# Altium footprint library PcbLib1.PcbLib: 31 footprints (part 2 of 2)
Each footprint in its own frame and in the unit in brackets; x right, y up, seen from the top. Pads: shape width x height; smd on the part's side, far side on the other; paste and mask are expansions set on the pad; w line width, h text height; cw(c..) or ccw(c..) is an arc to the next point about the centre after c.
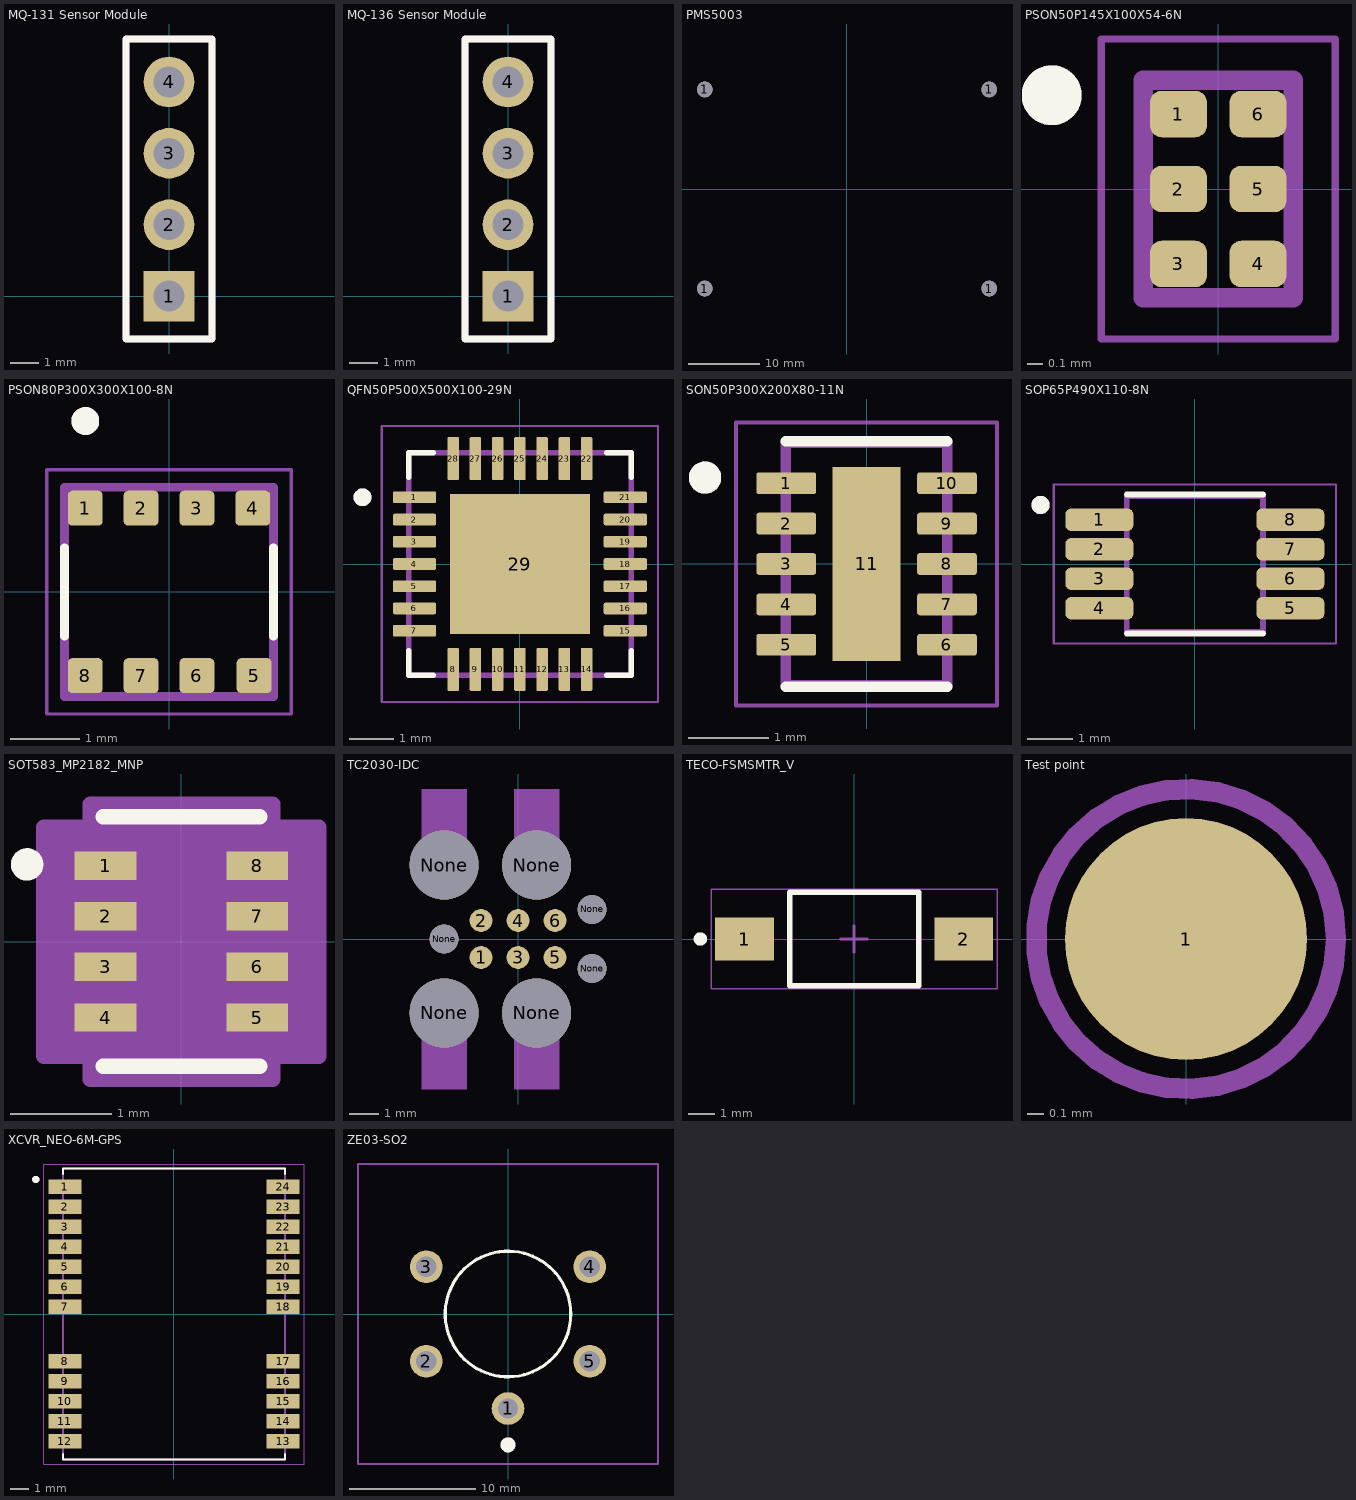
[diagram p1: the footprints below, top view; thin cyan lines are the x and y axes]

## MQ-131 Sensor Module [mm]
pads (4):
  rect 1.8x1.8 hole 1.1: 1(0,0)
  round 1.8 hole 1.1: 2(0,2.54) 3(0,5.08) 4(0,7.62)
Top Overlay:
  lines w0.254: -1.524,-1.524 1.524,-1.524 1.524,9.144 -1.524,9.144 -1.524,-1.524
Mechanical 13:
  lines w0.254: -1.524,-1.524 -1.524,9.144 1.524,9.144 1.524,-1.524 -1.524,-1.524
3D body "MQ-131 revised.step": height 41, standoff -2.12, extent -21.85,-6.465 0.303,14.035

## MQ-136 Sensor Module [mm]
pads (4):
  rect 1.8x1.8 hole 1.1: 1(0,0)
  round 1.8 hole 1.1: 2(0,2.54) 3(0,5.08) 4(0,7.62)
Top Overlay:
  lines w0.254: -1.524,-1.524 1.524,-1.524 1.524,9.144 -1.524,9.144 -1.524,-1.524
Mechanical 13:
  lines w0.254: -1.524,-1.524 -1.524,9.144 1.524,9.144 1.524,-1.524 -1.524,-1.524
3D body "MQ-131 revised.step": height 41, standoff -2.12, extent -21.85,-6.465 0.303,14.035

## PMS5003 [mm]
pads (4):
  round 2.2 hole 2.2 unplated: 1(-20,-14) 1(-20,14) 1(20,-14) 1(20,14)
3D body "PMS5003Case.step": height 20.9, standoff 0, extent -25,-19 25,19

## PSON50P145X100X54-6N [mm]
pads (6):
  rrect50% 0.38x0.31 smd: 1(-0.265,0.5) 2(-0.265,0) 3(-0.265,-0.5) 4(0.265,-0.5) 5(0.265,0) 6(0.265,0.5)
Top Overlay:
  circle w0.2: c-1.11,0.625 r0.1
Mechanical 13:
  circle w0.2: c-1.11,0.625 r0.1
  lines w0.127: -0.5,-0.725 -0.5,0.725 0.5,0.725 0.5,-0.725 -0.5,-0.725
Mechanical 15:
  lines w0.05: -0.78,-1 -0.78,1 0.78,1 0.78,-1 -0.78,-1
3D body "step_temp.STEP": height 0.5, standoff 0, extent -0.5,-0.725 0.5,0.725

## PSON80P300X300X100-8N [mm]
pads (8):
  rrect25% 0.5x0.5 smd: 1(-1.2,1.2) 2(-0.4,1.2) 3(0.4,1.2) 4(1.2,1.2) 5(1.22,-1.2) 6(0.4,-1.2) 7(-0.4,-1.2) 8(-1.2,-1.2)
Top Overlay:
  circle w0.2: c-1.2,2.45 r0.1
  lines w0.127: -1.5,-0.63 -1.5,0.63 ; 1.5,-0.63 1.5,0.63
Mechanical 13:
  circle w0.2: c-1.2,2.45 r0.1
  lines w0.127: -1.5,-1.5 -1.5,1.5 1.5,1.5 1.5,-1.5 -1.5,-1.5
Mechanical 15:
  lines w0.05: -1.75,-1.75 1.75,-1.75 1.75,1.75 -1.75,1.75 -1.75,-1.75
3D body "step_temp.STEP": height 1, standoff 0, extent -1.5,-1.5 1.5,1.5

## QFN50P500X500X100-29N [mm]
pads (29):
  rrect25% 0.97x0.26 smd: 1(-2.37,1.5) 2(-2.37,1) 3(-2.37,0.5) 4(-2.37,0) 5(-2.37,-0.5) 6(-2.37,-1) 7(-2.37,-1.5) 15(2.37,-1.5) 16(2.37,-1) 17(2.37,-0.5) 18(2.37,0) 19(2.37,0.5) 20(2.37,1) 21(2.37,1.5)
  rrect25% 0.26x0.97 smd: 8(-1.5,-2.37) 9(-1,-2.37) 10(-0.5,-2.37) 11(0,-2.37) 12(0.5,-2.37) 13(1,-2.37) 14(1.5,-2.37) 22(1.5,2.37) 23(1,2.37) 24(0.5,2.37) 25(0,2.37) 26(-0.5,2.37) 27(-1,2.37) 28(-1.5,2.37)
  rect 3.15x3.15 smd paste-0.575: 29(0,0)
Top Overlay:
  circle w0.2: c-3.54,1.5 r0.1
  lines w0.127: -2.5,-1.95 -2.5,-2.5 -1.95,-2.5 ; -2.5,1.95 -2.5,2.5 -1.95,2.5 ; 1.95,-2.5 2.5,-2.5 2.5,-1.95 ; 1.95,2.5 2.5,2.5 2.5,1.95
Mechanical 13:
  circle w0.2: c-3.54,1.5 r0.1
  lines w0.127: -2.5,-2.5 2.5,-2.5 2.5,2.5 -2.5,2.5 -2.5,-2.5
Mechanical 15:
  lines w0.05: -3.105,-3.105 3.105,-3.105 3.105,3.105 -3.105,3.105 -3.105,-3.105
3D body "step_temp.STEP": height 1, standoff 0, extent -2.5,-2.5 2.5,2.5

## Solar Cell [mm]
3D body "4.5 W Solar Panel, 6 V, 720 mA, Monocrystalline, Epoxy Coated, 165 x 165 mm.STEP": height 1.2, standoff -1.75, extent -82.5,-82.5 82.5,82.5

## SON50P300X200X80-11N [mm]
pads (11):
  rrect25% 0.74x0.27 smd: 1(-0.995,1) 2(-0.995,0.5) 3(-0.995,0) 4(-0.995,-0.5) 5(-0.995,-1) 6(0.995,-1) 7(0.995,-0.5) 8(0.995,0) 9(0.995,0.5) 10(0.995,1)
  rect 0.84x2.4 smd paste-2: 11(0,0)
Top Overlay:
  circle w0.2: c-2,1.07 r0.1
  lines w0.127: -1,-1.52 1,-1.52 ; -1,1.52 1,1.52
Mechanical 13:
  circle w0.2: c-2,1.07 r0.1
  lines w0.127: -1,-1.5 -1,1.5 1,1.5 1,-1.5 -1,-1.5
Mechanical 15:
  lines w0.05: -1.615,-1.75 -1.615,1.75 1.615,1.75 1.615,-1.75 -1.615,-1.75
3D body "step_temp.STEP": height 0.8, standoff 0, extent -1,-1.5 1,1.5

## SOP65P490X110-8N [mm]
pads (8):
  rrect50% 1.5x0.49 smd: 1(-2.105,0.975) 2(-2.105,0.325) 3(-2.105,-0.325) 4(-2.105,-0.975) 5(2.105,-0.975) 6(2.105,-0.325) 7(2.105,0.325) 8(2.105,0.975)
Top Overlay:
  circle w0.2: c-3.4,1.3 r0.1
  lines w0.127: -1.5,-1.534 1.5,-1.534 ; -1.5,1.534 1.5,1.534
Mechanical 13:
  circle w0.2: c-3.4,1.3 r0.1
  lines w0.127: -1.5,-1.5 -1.5,1.5 1.5,1.5 1.5,-1.5 -1.5,-1.5
Mechanical 15:
  lines w0.05: -3.11,-1.75 -3.11,1.75 3.11,1.75 3.11,-1.75 -3.11,-1.75
3D body "step_temp.STEP": height 1.1, standoff 0, extent -2.45,-1.5 2.45,1.5

## SOT583_MP2182_MNP [mil]
pads (8):
  rect 24x11 smd paste+0 mask+0: 1(-29.5,29.53) 2(-29.5,9.84) 3(-29.5,-9.84) 4(-29.5,-29.53) 5(29.5,-29.53) 6(29.5,-9.84) 7(29.5,9.84) 8(29.5,29.53)
Top Overlay:
  circle w6.3: c-60,30 r3.15
  lines w6: -30.5,-48.5 30.5,-48.5 ; -30.5,48.5 30.5,48.5
Mechanical 13:
  circle w0: c-17.5,29.53 r3
  lines w0: -12,43.5 ccw(c0,43.5) 12,43.5
  lines w1: -25.5,-43.5 25.5,-43.5 25.5,43.5 -25.5,43.5 -25.5,-43.5
Mechanical 15:
  region: 35.5,-53.5 -35.5,-53.5 -35.5,-44.53 -53.5,-44.53 -53.5,44.53 -35.5,44.53 -35.5,53.5 35.5,53.5 35.5,44.53 53.5,44.53 53.5,-44.53 35.5,-44.53
  lines w6: -53.5,-44.53 -35.5,-44.53 -35.5,-53.5 35.5,-53.5 35.5,-44.53 53.5,-44.53 53.5,44.53 35.5,44.53 35.5,53.5 -35.5,53.5 -35.5,44.53 -53.5,44.53 -53.5,-44.53
3D body "SOT583_MP2182_MNP.step": height 22.09, standoff 0, extent -33.5,-43.5 33.5,43.5

## TC2030-IDC [mil]
pads (13):
  round 31 smd: 1(-50,-25) 2(-50,25) 3(0,-25) 4(0,25) 5(50,-25) 6(50,25)
  round 93.5 hole 93.5 unplated: None(-100,-100) None(-100,100) None(25,-100) None(25,100)
  round 39 hole 39 unplated: None(-100,0) None(100,-40) None(100,40)
Mechanical 4:
  region: -130.5,-100 -69.5,-100 -69.5,-202.75 -130.5,-202.75
  region: -5.5,-100 55.5,-100 55.5,-202.75 -5.5,-202.75
  region: -130.5,202.75 -69.5,202.75 -69.5,100 -130.5,100
  region: -5.5,202.75 55.5,202.75 55.5,100 -5.5,100
  region: -130.5,-100 -69.5,-100 -69.5,-202.75 -130.5,-202.75
  region: -5.5,-100 55.5,-100 55.5,-202.75 -5.5,-202.75
  region: -130.5,202.75 -69.5,202.75 -69.5,100 -130.5,100
  region: -5.5,202.75 55.5,202.75 55.5,100 -5.5,100

## TECO-FSMSMTR_V [mm] "SMD, 2-Leads, Body 6x3.5mm, Pitch 9.19mm"
height 4.57
pads (2):
  rect 2.2x1.6 smd: 1(-4.097,0)
  rect 2.18x1.6 smd: 2(4.098,0)
Top Overlay:
  circle w0.25: c-5.747,0 r0.125
  lines w0.2: -2.413,-1.75 -2.413,1.75 2.413,1.75 2.413,-1.75 -2.413,-1.75
Mechanical 13:
  lines w0.1: -2.413,-1.75 -2.413,1.75 2.413,1.75 2.413,-1.75 -2.413,-1.75
Mechanical 15:
  lines w0.05: -5.334,-1.85 5.334,-1.85 5.334,1.85 -5.334,1.85 -5.334,-1.85
  lines w0.1: -0.51,0 0.49,0 ; -0.01,-0.5 -0.01,0.5
3D body "c-1437566-4-c-3d.stp": height 4.4, standoff -0.02, extent -4.985,-1.75 4.984,1.75

## Test point [mm] "Test point"
pads (1):
  round 1.5 smd: 1(0,0)
Mechanical 13:
  circle w0.127: c0,0 r0.93

## XCVR_NEO-6M-GPS [mm]
pads (24):
  rect 1.8x0.8 smd paste-2: 1(-6,7) 2(-6,5.9) 3(-6,4.8) 4(-6,3.7) 5(-6,2.6) 6(-6,1.5) 7(-6,0.4) 8(-6,-2.6) 9(-6,-3.7) 10(-6,-4.8) 11(-6,-5.9) 12(-6,-7) 13(6,-7) 14(6,-5.9) 15(6,-4.8) 16(6,-3.7) 17(6,-2.6) 18(6,0.4) 19(6,1.5) 20(6,2.6) 21(6,3.7) 22(6,4.8) 23(6,5.9) 24(6,7)
Top Overlay:
  circle w0.2: c-7.6,7.4 r0.1
  lines w0.127: -6.1,-7.72 -6.1,-8 6.1,-8 6.1,-7.72 ; -6.1,7.72 -6.1,8 6.1,8 6.1,7.72
Mechanical 13:
  circle w0.2: c-7.6,7.4 r0.1
  lines w0.127: -6.1,-8 6.1,-8 6.1,8 -6.1,8 -6.1,-8
Mechanical 15:
  lines w0.05: -7.15,-8.25 7.15,-8.25 7.15,8.25 -7.15,8.25 -7.15,-8.25
3D body "step_temp.STEP": height 2.6, standoff 0, extent -6.1,-8 6.1,8

## ZE03-SO2 [mm]
pads (5):
  round 2.6 hole 1.6: 1(0,-7.518) 2(-6.502,-3.759) 3(-6.502,3.759) 4(6.502,3.759) 5(6.502,-3.759)
Top Overlay:
  circle w0.8: c0,-10.414 r0.2
  circle w0.254: c0,0 r5
Mechanical 13:
  lines w0.127: -11.938,-11.938 -11.938,11.938 11.938,11.938 11.938,-11.938 10.922,-11.938 -11.938,-11.938
3D body "User Library-ZE03.STEP": height 26.8, standoff -4.7, extent -11.735,-11.75 11.735,11.75